# Altium footprint library Hydrolib_pcb.PcbLib: 97 footprints (part 2 of 7)
Each footprint in its own frame and in the unit in brackets; x right, y up, seen from the top. Pads: shape width x height; smd on the part's side, far side on the other; paste and mask are expansions set on the pad; w line width, h text height; cw(c..) or ccw(c..) is an arc to the next point about the centre after c.
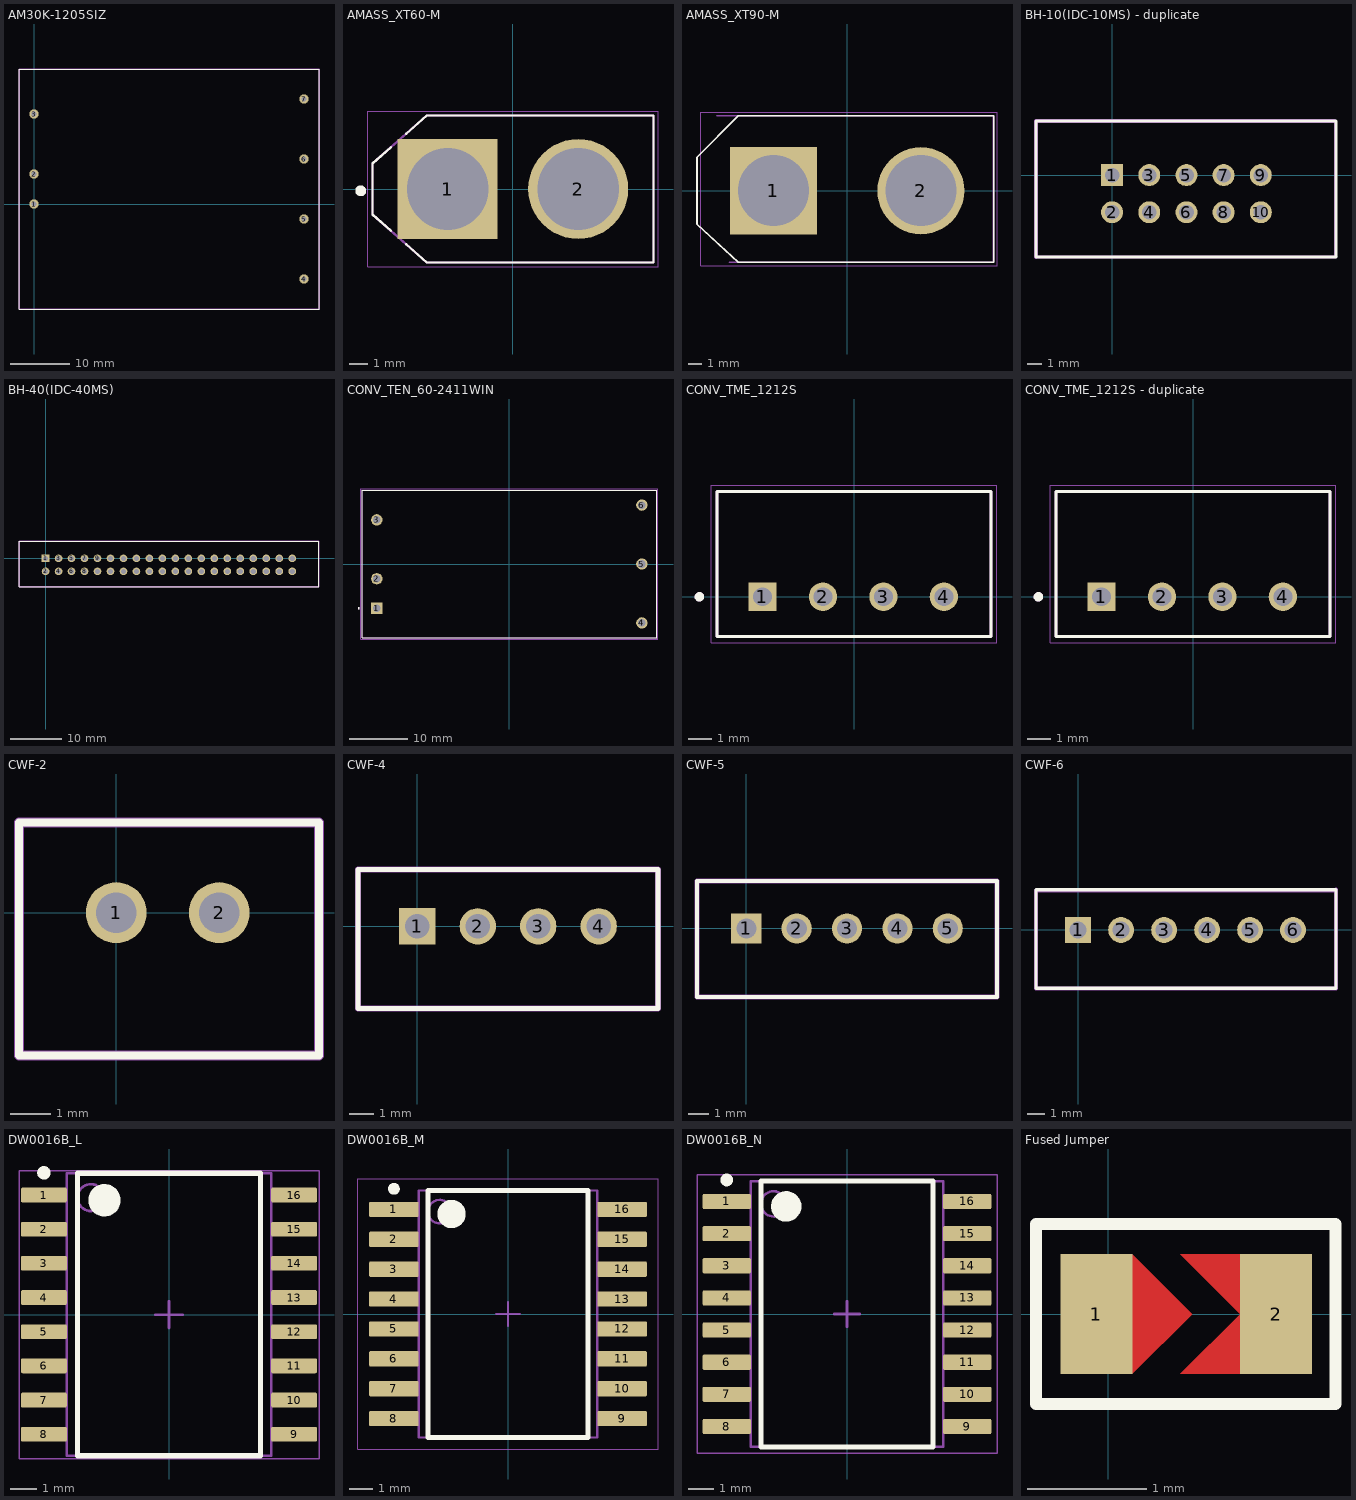
[diagram p1: the footprints below, top view; thin cyan lines are the x and y axes]

## AM30K-1205SIZ [mm]
pads (7):
  round 1.56 hole 0.9: 1(0,0) 2(0,5.08) 3(0,15.24) 4(45.72,-12.7) 5(45.72,-2.54) 6(45.72,7.62) 7(45.72,17.78)
Top Overlay:
  lines w0.2: 48.26,17.78 48.26,22.86 ; 48.26,22.86 48.26,-17.78 -2.54,-17.78 -2.54,22.86 48.26,22.86
Pattern top:
  lines w0.25: 48.26,17.78 48.26,22.86 ; 48.26,22.86 -2.54,22.86 -2.54,-17.78 48.26,-17.78 48.26,22.86
  text ".Designator" at 14.3,2.1 h2.15
3D body "AM30K-1205SIZ(DC-DC перобр).STEP": height 10.16, standoff -5.59, extent -2.54,-17.78 48.26,22.86

## AMASS_XT60-M [mm]
height 31
pads (2):
  rect 5.516x5.516 hole 4.5: 1(-3.6,0)
  round 5.516 hole 4.5: 2(3.6,0)
Top Overlay:
  circle w0.3: c-8.4,-0.1 r0.15
  lines w0.127: -6.73,-2.3 -7.75,-1.4 -7.75,1.4 -6.73,2.3 ; -5.88,-3.05 -4.75,-4.05 7.75,-4.05 7.75,4.05 -4.75,4.05 -5.88,3.05
Mechanical 13:
  lines w0.127: -7.75,-1.4 -4.75,-4.05 7.75,-4.05 7.75,4.05 -4.75,4.05 -7.75,1.4 -7.75,-1.4
Mechanical 15:
  lines w0.05: -8,-4.3 8,-4.3 8,4.3 -8,4.3 -8,-4.3
3D body "XT60-M--3DModel-STEP-56544.STEP": height 16, standoff -4.5, extent -7.369,-3.81 8.131,4.29

## AMASS_XT90-M [mm]
height 31
pads (2):
  rect 6.5x6.5 hole 5.3: 1(-5.5,0)
  round 6.5 hole 5.3: 2(5.5,0)
Top Overlay:
  lines w0.125: -11.2,-2.5 -8.128,-5.334 10.922,-5.334 10.922,5.588 -8.128,5.588 -11.2,2.5 -11.2,-2.5
Mechanical 13:
  lines w0.127: -9.705,5.588 10.922,5.588 10.922,-5.334 -8.796,-5.334
Mechanical 15:
  lines w0.05: -10.922,-5.588 -10.922,5.842 11.176,5.842 11.176,-5.588 -10.922,-5.588
3D body "User Library-XT90PB-M.step": height 21.9, standoff -4.5, extent -10.7,-5.4 10.7,5.4

## BH-10(IDC-10MS) - duplicate [mm]
pads (10):
  rect 1.5x1.5 hole 1: 1(0,0)
  round 1.5 hole 1: 2(0,-2.54) 3(2.54,0) 4(2.54,-2.54) 5(5.08,0) 6(5.08,-2.54) 7(7.62,0) 8(7.62,-2.54) 9(10.16,0) 10(10.16,-2.54)
Top Overlay:
  lines w0.2: 15.3,3.625 15.3,-5.6 -5.2,-5.6 -5.2,3.7 15.3,3.7
Pattern top:
  lines w0.2: -5.2,-5.6 15.3,-5.6 ; 15.275,-5.5 15.275,3.625
  lines w0.25: -5.2,-5.6 -5.2,3.7 15.2,3.7
  text ".Designator" at 0.7,1.6 h2.15
3D body "User Library-IDC-10MS.STEP": height 9.25, standoff -3.45, extent -5.125,-5.725 15.275,3.625

## BH-40(IDC-40MS) [mm]
pads (40):
  rect 1.5x1.5 hole 1: 1(0,0)
  round 1.5 hole 1: 2(0,-2.54) 3(2.54,0) 4(2.54,-2.54) 5(5.08,0) 6(5.08,-2.54) 7(7.62,0) 8(7.62,-2.54) 9(10.16,0) 10(10.16,-2.54) 11(12.7,0) 12(12.7,-2.54) 13(15.24,0) 14(15.24,-2.54) 15(17.78,0) 16(17.78,-2.54) 17(20.32,0) 18(20.32,-2.54) 19(22.86,0) 20(22.86,-2.54) 21(25.4,0) 22(25.4,-2.54) 23(27.94,0) 24(27.94,-2.54) 25(30.48,0) 26(30.48,-2.54) 27(33.02,0) 28(33.02,-2.54) 29(35.56,0) 30(35.56,-2.54) 31(38.1,0) 32(38.1,-2.54) 33(40.64,0) 34(40.64,-2.54) 35(43.18,0) 36(43.18,-2.54) 37(45.72,0) 38(45.72,-2.54) 39(48.26,0) 40(48.26,-2.54)
Top Overlay:
  lines w0.2: -5.2,-5.6 53.5,-5.6 53.5,3.4 -5.2,3.4 -5.2,-5.6
Bottom Overlay:
  lines w0.2: -5.2,-5.6 53.5,-5.6 53.5,3.4 -5.2,3.4 -5.2,-5.6
Pattern top:
  lines w0.25: -5.2,-5.6 -5.2,3.4 53.5,3.4 53.5,-5.6 -5.2,-5.6
  text ".Designator" at 19.6,1.4 h2.15
3D body "BH-40.STEP": height 9, standoff -3.1, extent -5.045,-5.795 53.355,3.205

## CONV_TEN_60-2411WIN [mm]
pads (6):
  rect 1.95x1.95 hole 1.3: 1(-22.86,-7.62)
  round 1.95 hole 1.3: 2(-22.86,-2.54) 3(-22.86,7.62) 4(22.86,-10.16) 5(22.86,0) 6(22.86,10.16)
Top Overlay:
  circle w0.2: c-26,-7.62 r0.1
  lines w0.127: -25.4,-12.7 25.4,-12.7 25.4,12.7 -25.4,12.7 -25.4,-12.7
Mechanical 13:
  circle w0.2: c-26,-7.62 r0.1
  lines w0.127: -25.4,-12.7 25.4,-12.7 25.4,12.7 -25.4,12.7 -25.4,-12.7
Mechanical 15:
  lines w0.05: -25.65,-12.95 -25.65,12.95 25.65,12.95 25.65,-12.95 -25.65,-12.95
3D body "ten_60-2411win.stp": height 10.2, standoff -5.6, extent -25.4,-12.7 25.4,12.7

## CONV_TME_1212S [mm]
pads (4):
  rect 1.19x1.19 hole 0.79: 1(-3.85,0)
  round 1.19 hole 0.79: 2(-1.31,0) 3(1.23,0) 4(3.77,0)
Top Overlay:
  circle w0.2: c-6.5,0 r0.1
  lines w0.127: -5.75,-1.673 5.75,-1.673 5.75,4.427 -5.75,4.427 -5.75,-1.673
Mechanical 13:
  circle w0.2: c-6.5,0 r0.1
  lines w0.127: -5.75,-1.673 5.75,-1.673 5.75,4.427 -5.75,4.427 -5.75,-1.673
Mechanical 15:
  lines w0.05: -6,-1.923 6,-1.923 6,4.677 -6,4.677 -6,-1.923

## CONV_TME_1212S - duplicate [mm]
pads (4):
  rect 1.19x1.19 hole 0.79: 1(-3.85,0)
  round 1.19 hole 0.79: 2(-1.31,0) 3(1.23,0) 4(3.77,0)
Top Overlay:
  circle w0.2: c-6.5,0 r0.1
  lines w0.127: -5.75,-1.673 5.75,-1.673 5.75,4.427 -5.75,4.427 -5.75,-1.673
Mechanical 13:
  circle w0.2: c-6.5,0 r0.1
  lines w0.127: -5.75,-1.673 5.75,-1.673 5.75,4.427 -5.75,4.427 -5.75,-1.673
Mechanical 15:
  lines w0.05: -6,-1.923 6,-1.923 6,4.677 -6,4.677 -6,-1.923

## CWF-2 [mm] "перемычка для плат"
pads (2):
  round 1.5 hole 1: 1(0,0) 2(2.54,0)
Top Overlay:
  lines w0.2: -2.4,-3.525 -2.4,2.225 5,2.225 5,-3.525 -2.4,-3.525
Pattern top:
  lines w0.25: -2.4,-3.525 5,-3.525 5,2.225 -2.4,2.225 -2.4,-3.525
  text ".Designator" at -1.7,-2.3 h2.15
3D body "User Library-CWF-2.STEP": height 7, standoff -3.5, extent -2.46,-3.55 5.04,2.2

## CWF-4 [mm]
pads (4):
  rect 1.5x1.5 hole 1 square: 1(0,0)
  round 1.5 hole 1: 2(2.5,0) 3(5,0) 4(7.5,0)
Top Overlay:
  lines w0.2: -2.45,-3.4 9.95,-3.4 9.95,0 9.95,2.35 -2.45,2.35 -2.45,-3.4
Pattern top:
  lines w0.25: -2.45,-3.4 -2.45,2.35 9.95,2.35 9.95,0 9.95,-3.4 -2.45,-3.4
  text ".Designator" at 0,-2.4 h2.15
3D body "User Library-CWF-4.step": height 7, standoff -3.5, extent -2.4,-3.525 10,2.225

## CWF-5 [mm]
pads (5):
  rect 1.5x1.5 hole 1: 1(0,0)
  round 1.5 hole 1: 2(2.5,0) 3(5,0) 4(7.5,0) 5(10,0)
Top Overlay:
  lines w0.2: -2.45,-3.4 -2.45,2.35 9.95,2.35 12.446,2.35 12.446,-3.4 -2.45,-3.4
Pattern top:
  lines w0.25: -2.45,-3.4 12.446,-3.4 12.446,2.35 9.95,2.35 -2.45,2.35 -2.45,-3.4
  text ".Designator" at 0.7,-2 h2.15
3D body "User Library-CWF-5.STEP": height 7, standoff -3.5, extent -2.5,-3.55 12.5,2.2

## CWF-6 [mm]
pads (6):
  rect 1.5x1.5 hole 1: 1(0,0)
  round 1.5 hole 1: 2(2.5,0) 3(5,0) 4(7.5,0) 5(10,0) 6(12.5,0)
Top Overlay:
  lines w0.2: -2.45,-3.4 15,-3.4 15,2.35 -2.45,2.35 -2.45,-3.4
Pattern top:
  lines w0.25: 15,2.3 -2.45,2.3 -2.45,-3.4 15,-3.4 15,2.35
  text ".Designator" at 0.7,-2 h2.15
3D body "User Library-CWF-6.STEP": height 7, standoff -3.5, extent -2.5,-3.55 15,2.2

## DW0016B_L [mm] "SOIC, 16-Leads, Body 10.5x7.6mm, Pitch 1.27mm, IPC High Density"
height 2.65
pads (16):
  rrect18% 1.7x0.55 smd: 1(-4.65,4.445) 2(-4.65,3.175) 3(-4.65,1.905) 4(-4.65,0.635) 5(-4.65,-0.635) 6(-4.65,-1.905) 7(-4.65,-3.175) 8(-4.65,-4.445) 9(4.65,-4.445) 10(4.65,-3.175) 11(4.65,-1.905) 12(4.65,-0.635) 13(4.65,0.635) 14(4.65,1.905) 15(4.65,3.175) 16(4.65,4.445)
Top Overlay:
  circle w0.6: c-2.4,4.25 r0.3
  circle w0.25: c-4.65,5.27 r0.125
  lines w0.2: -3.4,-5.25 3.4,-5.25 3.4,5.25 -3.4,5.25 -3.4,-5.25
Template:
  text ".Designator" at -2.032,-0.381 h1
Mechanical 13:
  circle w0.1: c-2.9,4.35 r0.5
  lines w0.1: -3.8,-5.25 3.8,-5.25 3.8,5.25 -3.8,5.25 -3.8,-5.25
Mechanical 15:
  lines w0.05: -5.575,-5.35 5.575,-5.35 5.575,5.35 -5.575,5.35 -5.575,-5.35
  lines w0.1: -0.5,0 0.5,0 ; 0,-0.5 0,0.5
3D body "DW0016B.stp": height 2.59, standoff 0, extent -5.168,-5.15 5.167,5.15

## DW0016B_M [mm] "SOIC, 16-Leads, Body 10.5x7.6mm, Pitch 1.27mm, IPC Low Density"
height 2.65
pads (16):
  rrect15% 2.1x0.65 smd: 1(-4.85,4.445) 2(-4.85,3.175) 3(-4.85,1.905) 4(-4.85,0.635) 5(-4.85,-0.635) 6(-4.85,-1.905) 7(-4.85,-3.175) 8(-4.85,-4.445) 9(4.85,-4.445) 10(4.85,-3.175) 11(4.85,-1.905) 12(4.85,-0.635) 13(4.85,0.635) 14(4.85,1.905) 15(4.85,3.175) 16(4.85,4.445)
Top Overlay:
  circle w0.25: c-4.85,5.32 r0.125
  circle w0.6: c-2.4,4.25 r0.3
  lines w0.2: -3.4,-5.25 -3.4,5.25 3.4,5.25 3.4,-5.25 -3.4,-5.25
Template:
  text ".Designator" at -2.54,-0.254 h1
Mechanical 13:
  circle w0.1: c-2.9,4.35 r0.5
  lines w0.1: -3.8,-5.25 -3.8,5.25 3.8,5.25 3.8,-5.25 -3.8,-5.25
Mechanical 15:
  lines w0.05: -6.375,-5.75 -6.375,5.75 6.375,5.75 6.375,-5.75 -6.375,-5.75
  lines w0.1: -0.5,0 0.5,0 ; 0,-0.5 0,0.5
3D body "DW0016B.stp": height 2.59, standoff 0, extent -5.168,-5.15 5.167,5.15

## DW0016B_N [mm] "SOIC, 16-Leads, Body 10.5x7.6mm, Pitch 1.27mm, IPC Medium Density"
height 2.65
pads (16):
  rrect17% 1.9x0.6 smd: 1(-4.75,4.445) 2(-4.75,3.175) 3(-4.75,1.905) 4(-4.75,0.635) 5(-4.75,-0.635) 6(-4.75,-1.905) 7(-4.75,-3.175) 8(-4.75,-4.445) 9(4.75,-4.445) 10(4.75,-3.175) 11(4.75,-1.905) 12(4.75,-0.635) 13(4.75,0.635) 14(4.75,1.905) 15(4.75,3.175) 16(4.75,4.445)
Top Overlay:
  circle w0.25: c-4.75,5.295 r0.125
  circle w0.6: c-2.4,4.25 r0.3
  lines w0.2: -3.4,-5.25 -3.4,5.25 3.4,5.25 3.4,-5.25 -3.4,-5.25
Template:
  text ".Designator" at -1.778,-0.381 h1
Mechanical 13:
  circle w0.1: c-2.9,4.35 r0.5
  lines w0.1: -3.8,-5.25 -3.8,5.25 3.8,5.25 3.8,-5.25 -3.8,-5.25
Mechanical 15:
  lines w0.05: -5.925,-5.5 -5.925,5.5 5.925,5.5 5.925,-5.5 -5.925,-5.5
  lines w0.1: -0.5,0 0.5,0 ; 0,-0.5 0,0.5
3D body "DW0016B.stp": height 2.59, standoff 0, extent -5.168,-5.15 5.167,5.15

## Fused Jumper [mm] "Solder fused jumper"
pads (2):
  rect 0.6x1 smd: 1(-0.1,0) 2(1.4,0)
Top Layer:
  region: 0.2,0.5 0.7,0 0.2,-0.5
  region: 1.1,-0.5 0.6,-0.5 1.1,0
  region: 1.1,0 0.6,0.5 1.1,0.5
Top Overlay:
  lines w0.1: -0.605,-0.75 -0.605,0.75 1.895,0.75 1.895,-0.75 -0.605,-0.75
Top Paste:
  region: 1.1,-0.5 0.6,-0.5 1.1,0
  region: 1.1,0 0.6,0.5 1.1,0.5
  region: 0.2,0.5 0.7,0 0.2,-0.5
Top Solder:
  region: 0.3,0.6 0.3,-0.6 1,-0.6 1,0.6
Pattern top:
  text ".Designator" at -1.6,1.003 h1.52